# Altium footprint library hphonglib.PcbLib: 1250 footprints (part 76 of 79)
Each footprint in its own frame and in the unit in brackets; x right, y up, seen from the top. Pads: shape width x height; smd on the part's side, far side on the other; paste and mask are expansions set on the pad; w line width, h text height; cw(c..) or ccw(c..) is an arc to the next point about the centre after c.
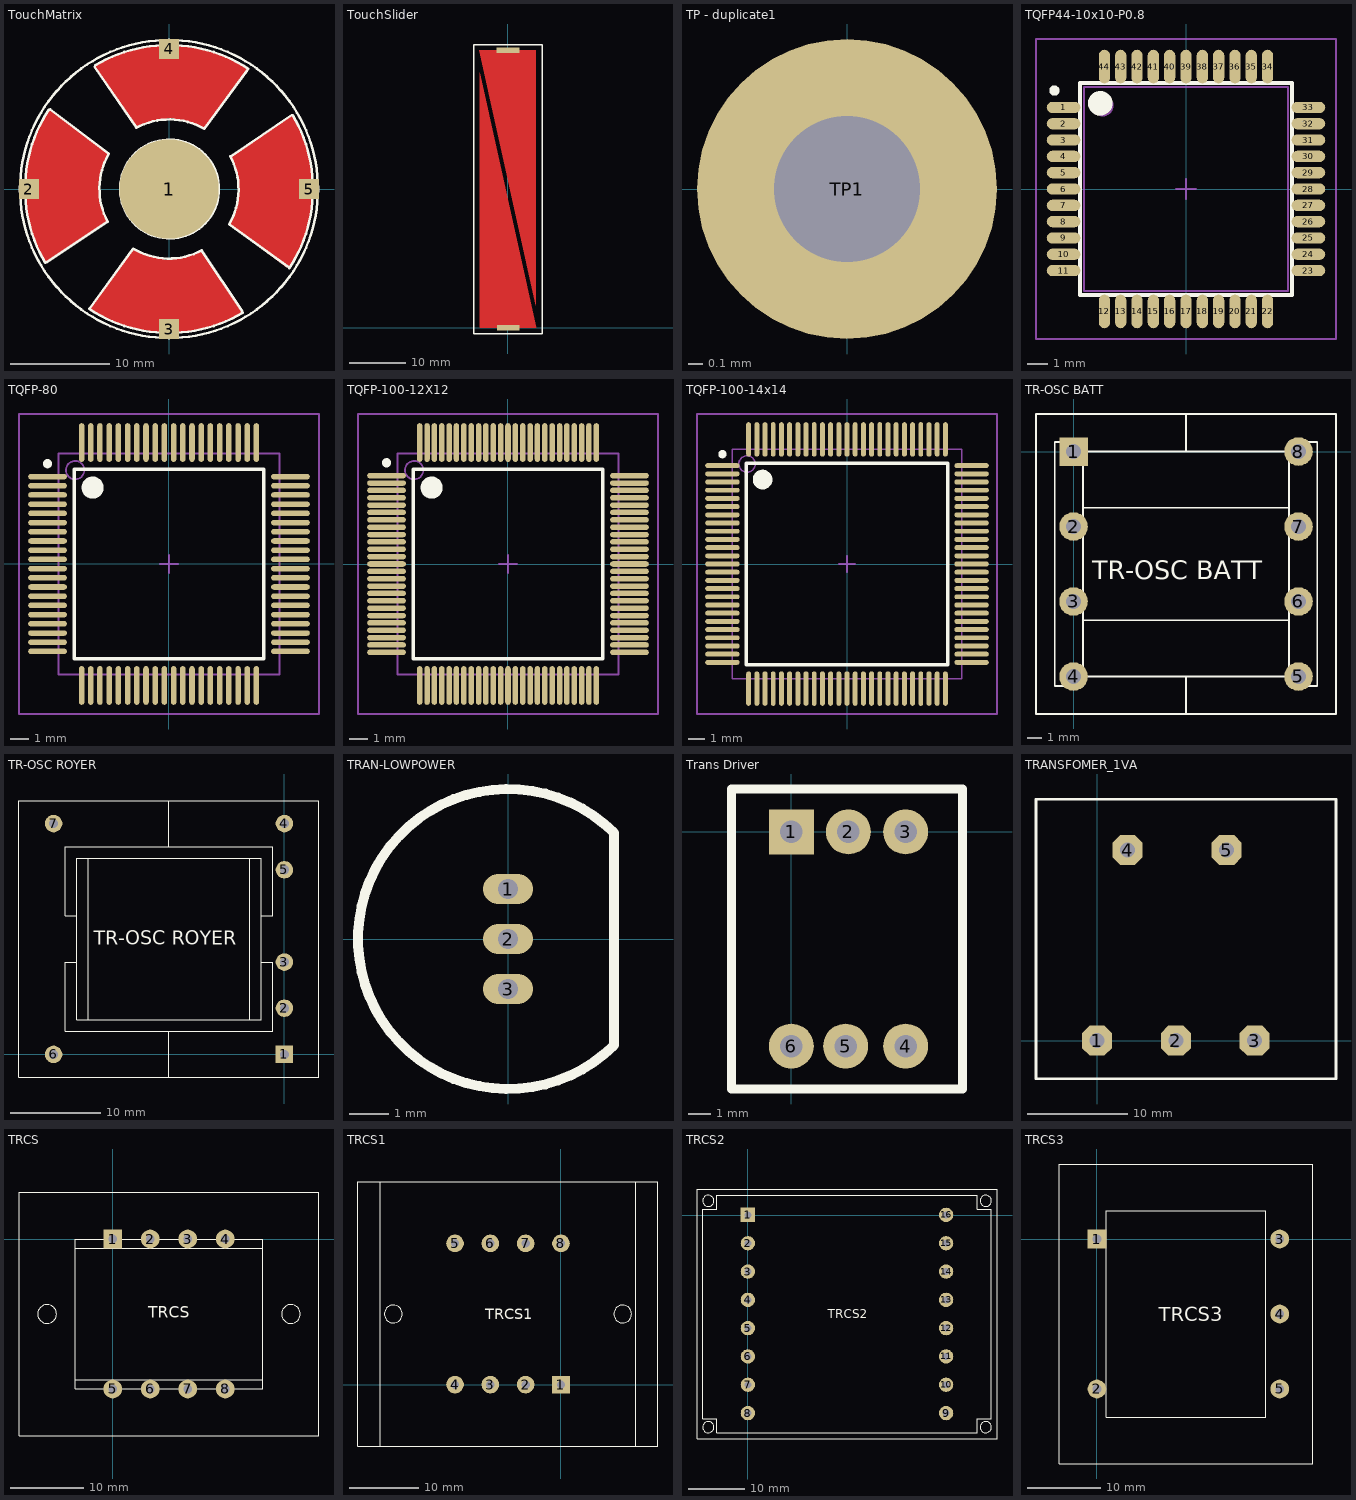
[diagram p75: the footprints below, top view; thin cyan lines are the x and y axes]

## TouchMatrix [mm]
pads (5):
  round 10 smd paste+0 mask+0: 1(0,0)
  rect 2x2 smd paste+0 mask+0: 2(-14.097,0) 3(0,-14.097) 4(0,14.097) 5(14.097,0)
Top Layer:
  region: -3.302,6.223 -7.366,12.192 -7.366,12.319 -7.366,12.395 -7.308,12.535 -7.201,12.642 -7.061,12.7 -6.985,12.7 -4.699,13.716 -1.905,14.351 0.635,14.478 3.175,14.097 5.08,13.589 7.62,12.319 7.671,12.319 7.764,12.28 7.835,12.209 7.874,12.116 7.874,12.065 7.874,11.811 3.556,6.096 2.54,6.604 1.27,6.858 0.254,7.112 -1.27,6.985 -2.667,6.477
  region: 6.223,3.302 12.192,7.366 12.319,7.366 12.395,7.366 12.535,7.308 12.642,7.201 12.7,7.061 12.7,6.985 13.716,4.699 14.351,1.905 14.478,-0.635 14.097,-3.175 13.589,-5.08 12.319,-7.62 12.319,-7.671 12.28,-7.764 12.209,-7.835 12.116,-7.874 12.065,-7.874 11.811,-7.874 6.096,-3.556 6.604,-2.54 6.858,-1.27 7.112,-0.254 6.985,1.27 6.477,2.667
  region: -6.223,-3.302 -12.192,-7.366 -12.319,-7.366 -12.395,-7.366 -12.535,-7.308 -12.642,-7.201 -12.7,-7.061 -12.7,-6.985 -13.716,-4.699 -14.351,-1.905 -14.478,0.635 -14.097,3.175 -13.589,5.08 -12.319,7.62 -12.319,7.671 -12.28,7.764 -12.209,7.835 -12.116,7.874 -12.065,7.874 -11.811,7.874 -6.096,3.556 -6.604,2.54 -6.858,1.27 -7.112,0.254 -6.985,-1.27 -6.477,-2.667
  region: 3.302,-6.223 7.366,-12.192 7.366,-12.319 7.366,-12.395 7.308,-12.535 7.201,-12.642 7.061,-12.7 6.985,-12.7 4.699,-13.716 1.905,-14.351 -0.635,-14.478 -3.175,-14.097 -5.08,-13.589 -7.62,-12.319 -7.671,-12.319 -7.764,-12.28 -7.835,-12.209 -7.874,-12.116 -7.874,-12.065 -7.874,-11.811 -3.556,-6.096 -2.54,-6.604 -1.27,-6.858 -0.254,-7.112 1.27,-6.985 2.667,-6.477
Top Overlay:
  circle w0.254: c0,0 r15
  circle w0.254: c0.051,0 r4.973
  lines w0.254: -12.445,-7.441 cw(c0,0) -12.099,7.992 ; -12.319,-7.366 -6.223,-3.302 ; -11.938,8.001 -6.096,3.556 ; -8.001,-12.065 -3.683,-6.096 ; -7.992,-12.099 ccw(c0,0) 7.441,-12.445 ; -7.493,12.319 -3.299,6.225 ; -7.441,12.445 cw(c0,0) 7.992,12.099 ; -6.177,-3.278 cw(c0,0.015) -6.053,3.531 ; -3.605,-6.009 ccw(c-0.015,0) 3.292,-6.17 ; -3.292,6.17 cw(c0.015,0) 3.531,6.053 ; 3.302,-6.223 7.366,-12.319 ; 3.556,6.096 7.874,11.938 ; 6.053,-3.531 ccw(c0,-0.015) 6.17,3.292 ; 6.096,-3.556 12.065,-7.874 ; 6.294,3.333 12.354,7.441 ; 12.099,-7.992 ccw(c0,0) 12.445,7.441

## TouchSlider [mm]
pads (2):
  rect 4x1 smd paste+0 mask+0: 1(0.025,0.025) 2(0,49.025)
Top Layer:
  region: 5,0.025 -5,0.05 -4.975,45.05
  region: -5.1,49.025 4.9,49 4.875,4
Top Overlay:
  lines w0.254: -6,-1.025 6.025,-1.025 6.025,50.025 -6,50.025 -6,-1.025

## TP - duplicate1 [mil] "Connect 1"
pads (1):
  round 80 hole 39: TP1(0,0)
3D body "socket 1-1.stp": height 178.54, standoff -113.98, extent -50,-50 50,50

## TQFP44-10x10-P0.8 [mm] "QFP, 44-Leads, Body 10x10mm, Pitch 0.8mm, IPC High Density"
height 2.44
pads (44):
  oval 1.65x0.55 smd: 1(-6,4) 2(-6,3.2) 3(-6,2.4) 4(-6,1.6) 5(-6,0.8) 6(-6,0) 7(-6,-0.8) 8(-6,-1.6) 9(-6,-2.4) 10(-6,-3.2) 11(-6,-4) 23(6,-4) 24(6,-3.2) 25(6,-2.4) 26(6,-1.6) 27(6,-0.8) 28(6,0) 29(6,0.8) 30(6,1.6) 31(6,2.4) 32(6,3.2) 33(6,4)
  oval 0.55x1.65 smd: 12(-4,-6) 13(-3.2,-6) 14(-2.4,-6) 15(-1.6,-6) 16(-0.8,-6) 17(0,-6) 18(0.8,-6) 19(1.6,-6) 20(2.4,-6) 21(3.2,-6) 22(4,-6) 34(4,6) 35(3.2,6) 36(2.4,6) 37(1.6,6) 38(0.8,6) 39(0,6) 40(-0.8,6) 41(-1.6,6) 42(-2.4,6) 43(-3.2,6) 44(-4,6)
Top Overlay:
  circle w0.6: c-4.2,4.2 r0.3
  circle w0.25: c-6.45,4.825 r0.125
  lines w0.2: -5.2,-5.2 5.2,-5.2 5.2,5.2 -5.2,5.2 -5.2,-5.2
Mechanical 13:
  circle w0.1: c-4.1,4.1 r0.5
  lines w0.1: -5,-5 5,-5 5,5 -5,5 -5,-5
Mechanical 15:
  lines w0.1: -0.5,0 0.5,0 ; 0,-0.5 0,0.5 ; -7.35,-7.35 7.35,-7.35 7.35,7.35 -7.35,7.35 -7.35,-7.35
3D body "User Library-TQFP44.step": height 1.07, standoff 0, extent -5.994,-5.994 6.006,6.006

## TQFP-80 [mm] "Thin QFP, 80-Leads, Body 12x12mm, Pitch 0.5mm, IPC Low Density"
height 1.2
pads (80):
  oval 2.1x0.3 smd: 1(-6.6,4.75) 2(-6.6,4.25) 3(-6.6,3.75) 4(-6.6,3.25) 5(-6.6,2.75) 6(-6.6,2.25) 7(-6.6,1.75) 8(-6.6,1.25) 9(-6.6,0.75) 10(-6.6,0.25) 11(-6.6,-0.25) 12(-6.6,-0.75) 13(-6.6,-1.25) 14(-6.6,-1.75) 15(-6.6,-2.25) 16(-6.6,-2.75) 17(-6.6,-3.25) 18(-6.6,-3.75) 19(-6.6,-4.25) 20(-6.6,-4.75) 41(6.6,-4.75) 42(6.6,-4.25) 43(6.6,-3.75) 44(6.6,-3.25) 45(6.6,-2.75) 46(6.6,-2.25) 47(6.6,-1.75) 48(6.6,-1.25) 49(6.6,-0.75) 50(6.6,-0.25) 51(6.6,0.25) 52(6.6,0.75) 53(6.6,1.25) 54(6.6,1.75) 55(6.6,2.25) 56(6.6,2.75) 57(6.6,3.25) 58(6.6,3.75) 59(6.6,4.25) 60(6.6,4.75)
  oval 0.3x2.1 smd: 21(-4.75,-6.6) 22(-4.25,-6.6) 23(-3.75,-6.6) 24(-3.25,-6.6) 25(-2.75,-6.6) 26(-2.25,-6.6) 27(-1.75,-6.6) 28(-1.25,-6.6) 29(-0.75,-6.6) 30(-0.25,-6.6) 31(0.25,-6.6) 32(0.75,-6.6) 33(1.25,-6.6) 34(1.75,-6.6) 35(2.25,-6.6) 36(2.75,-6.6) 37(3.25,-6.6) 38(3.75,-6.6) 39(4.25,-6.6) 40(4.75,-6.6) 61(4.75,6.6) 62(4.25,6.6) 63(3.75,6.6) 64(3.25,6.6) 65(2.75,6.6) 66(2.25,6.6) 67(1.75,6.6) 68(1.25,6.6) 69(0.75,6.6) 70(0.25,6.6) 71(-0.25,6.6) 72(-0.75,6.6) 73(-1.25,6.6) 74(-1.75,6.6) 75(-2.25,6.6) 76(-2.75,6.6) 77(-3.25,6.6) 78(-3.75,6.6) 79(-4.25,6.6) 80(-4.75,6.6)
Top Overlay:
  circle w0.6: c-4.15,4.15 r0.3
  circle w0.25: c-6.6,5.45 r0.125
  lines w0.2: -5.15,-5.15 5.15,-5.15 5.15,5.15 -5.15,5.15 -5.15,-5.15
Mechanical 13:
  circle w0.1: c-5.1,5.1 r0.5
  lines w0.1: -6,-6 6,-6 6,6 -6,6 -6,-6
Mechanical 15:
  lines w0.1: -0.5,0 0.5,0 ; 0,-0.5 0,0.5 ; -8.15,-8.15 8.15,-8.15 8.15,8.15 -8.15,8.15 -8.15,-8.15
3D body: height 1.2, standoff 0, extent -6,-6 6,6

## TQFP-100-12X12 [mm] "Shrink QFP, 100-Leads, Body 12x12mm, Pitch 0.4mm, IPC High Density"
height 2.2
pads (100):
  oval 2.1x0.3 smd: 1(-6.6,4.8) 2(-6.6,4.4) 3(-6.6,4) 4(-6.6,3.6) 5(-6.6,3.2) 6(-6.6,2.8) 7(-6.6,2.4) 8(-6.6,2) 9(-6.6,1.6) 10(-6.6,1.2) 11(-6.6,0.8) 12(-6.6,0.4) 13(-6.6,0) 14(-6.6,-0.4) 15(-6.6,-0.8) 16(-6.6,-1.2) 17(-6.6,-1.6) 18(-6.6,-2) 19(-6.6,-2.4) 20(-6.6,-2.8) 21(-6.6,-3.2) 22(-6.6,-3.6) 23(-6.6,-4) 24(-6.6,-4.4) 25(-6.6,-4.8) 51(6.6,-4.8) 52(6.6,-4.4) 53(6.6,-4) 54(6.6,-3.6) 55(6.6,-3.2) 56(6.6,-2.8) 57(6.6,-2.4) 58(6.6,-2) 59(6.6,-1.6) 60(6.6,-1.2) 61(6.6,-0.8) 62(6.6,-0.4) 63(6.6,0) 64(6.6,0.4) 65(6.6,0.8) 66(6.6,1.2) 67(6.6,1.6) 68(6.6,2) 69(6.6,2.4) 70(6.6,2.8) 71(6.6,3.2) 72(6.6,3.6) 73(6.6,4) 74(6.6,4.4) 75(6.6,4.8)
  oval 0.3x2.1 smd: 26(-4.8,-6.6) 27(-4.4,-6.6) 28(-4,-6.6) 29(-3.6,-6.6) 30(-3.2,-6.6) 31(-2.8,-6.6) 32(-2.4,-6.6) 33(-2,-6.6) 34(-1.6,-6.6) 35(-1.2,-6.6) 36(-0.8,-6.6) 37(-0.4,-6.6) 38(0,-6.6) 39(0.4,-6.6) 40(0.8,-6.6) 41(1.2,-6.6) 42(1.6,-6.6) 43(2,-6.6) 44(2.4,-6.6) 45(2.8,-6.6) 46(3.2,-6.6) 47(3.6,-6.6) 48(4,-6.6) 49(4.4,-6.6) 50(4.8,-6.6) 76(4.8,6.6) 77(4.4,6.6) 78(4,6.6) 79(3.6,6.6) 80(3.2,6.6) 81(2.8,6.6) 82(2.4,6.6) 83(2,6.6) 84(1.6,6.6) 85(1.2,6.6) 86(0.8,6.6) 87(0.4,6.6) 88(0,6.6) 89(-0.4,6.6) 90(-0.8,6.6) 91(-1.2,6.6) 92(-1.6,6.6) 93(-2,6.6) 94(-2.4,6.6) 95(-2.8,6.6) 96(-3.2,6.6) 97(-3.6,6.6) 98(-4,6.6) 99(-4.4,6.6) 100(-4.8,6.6)
Top Overlay:
  circle w0.6: c-4.15,4.15 r0.3
  circle w0.25: c-6.6,5.5 r0.125
  lines w0.2: -5.15,-5.15 5.15,-5.15 5.15,5.15 -5.15,5.15 -5.15,-5.15
Mechanical 13:
  circle w0.1: c-5.1,5.1 r0.5
  lines w0.1: -6,-6 6,-6 6,6 -6,6 -6,-6
Mechanical 15:
  lines w0.1: -0.5,0 0.5,0 ; 0,-0.5 0,0.5 ; -8.15,-8.15 8.15,-8.15 8.15,8.15 -8.15,8.15 -8.15,-8.15
3D body: height 2.2, standoff 0, extent -6,-6 6,6

## TQFP-100-14x14 [mm] "Thin QFP, 100-Leads, Body 14x14mm, Pitch 0.5mm, IPC Low Density"
height 1.6
pads (100):
  oval 2.1x0.3 smd: 1(-7.6,6) 2(-7.6,5.5) 3(-7.6,5) 4(-7.6,4.5) 5(-7.6,4) 6(-7.6,3.5) 7(-7.6,3) 8(-7.6,2.5) 9(-7.6,2) 10(-7.6,1.5) 11(-7.6,1) 12(-7.6,0.5) 13(-7.6,0) 14(-7.6,-0.5) 15(-7.6,-1) 16(-7.6,-1.5) 17(-7.6,-2) 18(-7.6,-2.5) 19(-7.6,-3) 20(-7.6,-3.5) 21(-7.6,-4) 22(-7.6,-4.5) 23(-7.6,-5) 24(-7.6,-5.5) 25(-7.6,-6) 51(7.6,-6) 52(7.6,-5.5) 53(7.6,-5) 54(7.6,-4.5) 55(7.6,-4) 56(7.6,-3.5) 57(7.6,-3) 58(7.6,-2.5) 59(7.6,-2) 60(7.6,-1.5) 61(7.6,-1) 62(7.6,-0.5) 63(7.6,0) 64(7.6,0.5) 65(7.6,1) 66(7.6,1.5) 67(7.6,2) 68(7.6,2.5) 69(7.6,3) 70(7.6,3.5) 71(7.6,4) 72(7.6,4.5) 73(7.6,5) 74(7.6,5.5) 75(7.6,6)
  oval 0.3x2.1 smd: 26(-6,-7.6) 27(-5.5,-7.6) 28(-5,-7.6) 29(-4.5,-7.6) 30(-4,-7.6) 31(-3.5,-7.6) 32(-3,-7.6) 33(-2.5,-7.6) 34(-2,-7.6) 35(-1.5,-7.6) 36(-1,-7.6) 37(-0.5,-7.6) 38(0,-7.6) 39(0.5,-7.6) 40(1,-7.6) 41(1.5,-7.6) 42(2,-7.6) 43(2.5,-7.6) 44(3,-7.6) 45(3.5,-7.6) 46(4,-7.6) 47(4.5,-7.6) 48(5,-7.6) 49(5.5,-7.6) 50(6,-7.6) 76(6,7.6) 77(5.5,7.6) 78(5,7.6) 79(4.5,7.6) 80(4,7.6) 81(3.5,7.6) 82(3,7.6) 83(2.5,7.6) 84(2,7.6) 85(1.5,7.6) 86(1,7.6) 87(0.5,7.6) 88(0,7.6) 89(-0.5,7.6) 90(-1,7.6) 91(-1.5,7.6) 92(-2,7.6) 93(-2.5,7.6) 94(-3,7.6) 95(-3.5,7.6) 96(-4,7.6) 97(-4.5,7.6) 98(-5,7.6) 99(-5.5,7.6) 100(-6,7.6)
Top Overlay:
  circle w0.6: c-5.15,5.15 r0.3
  circle w0.25: c-7.6,6.7 r0.125
  lines w0.2: -6.15,-6.15 6.15,-6.15 6.15,6.15 -6.15,6.15 -6.15,-6.15
Mechanical 13:
  circle w0.1: c-6.1,6.1 r0.5
  lines w0.1: -7,-7 7,-7 7,7 -7,7 -7,-7
Mechanical 15:
  lines w0.1: -0.5,0 0.5,0 ; 0,-0.5 0,0.5 ; -9.15,-9.15 9.15,-9.15 9.15,9.15 -9.15,9.15 -9.15,-9.15
3D body: height 1.6, standoff 0, extent -7,-7 7,7

## TR-OSC BATT [mil] "Transformer oscillator for battery power - E30"
pads (8):
  rect 76x76 hole 39.37 unplated: 1(0,0)
  round 76 hole 39.37 unplated: 2(0,-200) 3(0,-400) 4(0,-600) 5(600,-600) 6(600,-400) 7(600,-200) 8(600,0)
Top Overlay:
  lines w5: 25,-600 575,-600 ; 25,-450 575,-450 ; 25,-150 575,-150 ; 25,0 575,0 ; 100,0 150,0 ; 300,-700 300,-600 ; 300,0 300,100 ; -100,-700 -100,100 700,100 700,-700 -100,-700 ; -50,-625 25,-625 25,25 -50,25 -50,-625 ; 575,-625 575,25 650,25 650,-625 575,-625
  text "TR-OSC BATT" at 50,-340 h50

## TR-OSC ROYER [mil] "Transformer Royer oscillator - E30"
pads (7):
  rect 76x76 hole 39.37 unplated: 1(0,0)
  round 76 hole 39.37 unplated: 2(0,200) 3(0,400) 4(0,1000) 5(0,800) 6(-1000,0) 7(-1000,1000)
Top Overlay:
  lines w5: -900,400 -950,400 -950,100 -50,100 -50,400 -100,400 ; -900,600 -950,600 -950,900 -50,900 -50,600 -100,600 ; -850,150 -850,850 ; -500,-100 -500,100 ; -500,900 -500,1100 ; -150,150 -150,850 ; -1150,-100 -1150,1100 150,1100 150,-100 -1150,-100 ; -900,150 -900,850 -100,850 -100,150 -900,150
  text "TR-OSC ROYER" at -825,475 h60.8

## TRAN-LOWPOWER [mil] "TO, Flat Index; 3 In-Line, Axial Leads; Body Dia. 4.5mm; Leads 0.51 x 0.48 mm (max)"
height 270.08
pads (3):
  oval 50x30 hole 20: 1(0,50) 2(0,0) 3(0,-50)
Top Overlay:
  lines w10: 106.07,-106.07 cw(c0,0) 106.07,106.07 106.07,-106.07
3D body "SW3dPS-TO-92A.STEP": height 314.96, standoff -118.11, extent -100,-94.48 54.72,94.49

## Trans Driver [mm] "driver transformer"
pads (6):
  rect 2x2 hole 1: 1(0,0)
  round 2 hole 1: 2(2.54,0) 3(5.08,0) 4(5.08,-9.525) 5(2.413,-9.525) 6(0,-9.525)
Top Overlay:
  lines w0.4: -2.667,1.905 -2.667,-11.43 7.62,-11.43 7.62,1.905 -2.54,1.905

## TRANSFOMER_1VA [mm]
pads (5):
  oct 3x3 hole 1.5: 1(0,0) 2(7.874,0) 3(15.748,0) 4(3.048,19.05) 5(12.954,19.05)
Top Overlay:
  lines w0.254: -5.334,24.13 23.876,24.13 23.876,-3.81 -6.096,-3.81 -6.096,24.13 -5.08,24.13
3D body "User Library-xfmr_BEI_HF24E2.step": height 34.57, standoff -2.97, extent -8.352,-4.765 27.148,26.106

## TRCS [mm] "Transformer Power 3VA - Body 40x32 mm"
pads (8):
  rect 2.54x2.54 hole 1.2: 1(0,0)
  round 2.54 hole 1.2: 2(5.08,0) 3(10.16,0) 4(15.24,0) 5(0,-20.32) 6(5.08,-20.32) 7(10.16,-20.32) 8(15.24,-20.32)
Top Overlay:
  circle w0.127: c24.13,-10.16 r1.27
  circle w0.127: c-8.89,-10.16 r1.27
  lines w0.127: -5.08,-19.05 20.32,-19.05 ; -5.08,-1.27 20.32,-1.27 ; -12.7,-26.67 -12.7,6.35 27.94,6.35 27.94,-26.67 -12.7,-26.67 ; -5.08,-20.32 -5.08,0 20.32,0 20.32,-20.32 -5.08,-20.32
  text "TRCS" at 4.826,-10.668 h1.54

## TRCS1 [mm] "Transformer Power 3.5VA - Body 44x38 mm - GBC TYPE"
pads (8):
  rect 2.54x2.54 hole 1.2: 1(0,0)
  round 2.54 hole 1.2: 2(-5.08,0) 3(-10.16,0) 4(-15.24,0) 5(-15.24,20.32) 6(-10.16,20.32) 7(-5.08,20.32) 8(0,20.32)
Top Overlay:
  circle w0.127: c8.89,10.16 r1.27
  circle w0.127: c-24.13,10.16 r1.27
  lines w0.127: -26.035,-8.89 -26.035,29.21 ; 10.795,-8.89 10.795,29.21 ; -29.21,-8.89 -29.21,29.21 13.97,29.21 13.97,-8.89 -29.21,-8.89
  text "TRCS1" at -10.922,9.398 h1.54

## TRCS2 [mil] "Transformer Power 5VA - Body 54x44 mm"
pads (16):
  rect 100x100 hole 47.24: 1(0,3)
  round 100 hole 47.24: 2(0,-194) 3(0,-391) 4(0,-588) 5(0,-784) 6(0,-981) 7(0,-1178) 8(0,-1375) 9(1378,-1375) 10(1378,-1178) 11(1378,-981) 12(1378,-784) 13(1378,-588) 14(1378,-391) 15(1378,-194) 16(1378,3)
Top Overlay:
  circle w5: c1654,101 r39
  circle w5: c1654,-1473 r39
  circle w5: c-276,-1473 r39
  circle w5: c-276,101 r39
  lines w5: -354,-1552 1732,-1552 1732,180 -354,180 -354,-1552 ; -315,-1414 -217,-1414 -217,-1513 1594,-1513 1594,-1414 1693,-1414 1693,42 1594,42 1594,141 -217,141 -217,42 -315,42 -315,-1414
  text "TRCS2" at 553.91,-716.02 h60.04

## TRCS3 [mm] "Transformer Power 3VA - Body 40x35 mm"
pads (5):
  rect 2.54x2.54 hole 1.2: 1(0,0)
  round 2.54 hole 1.2: 2(0,-20.32) 3(24.765,0) 4(24.765,-10.16) 5(24.765,-20.32)
Top Overlay:
  lines w0.127: -5.08,-30.48 -5.08,10.16 29.21,10.16 29.21,-30.48 -5.08,-30.48 ; 1.27,-24.13 1.27,3.81 22.86,3.81 22.86,-24.13 1.27,-24.13
  text "TRCS3" at 8.357,-11.125 h1.93